# Altium footprint library Connectors.PCBLIB: 126 footprints (part 8 of 8)
Each footprint in its own frame and in the unit in brackets; x right, y up, seen from the top. Pads: shape width x height; smd on the part's side, far side on the other; paste and mask are expansions set on the pad; w line width, h text height; cw(c..) or ccw(c..) is an arc to the next point about the centre after c.
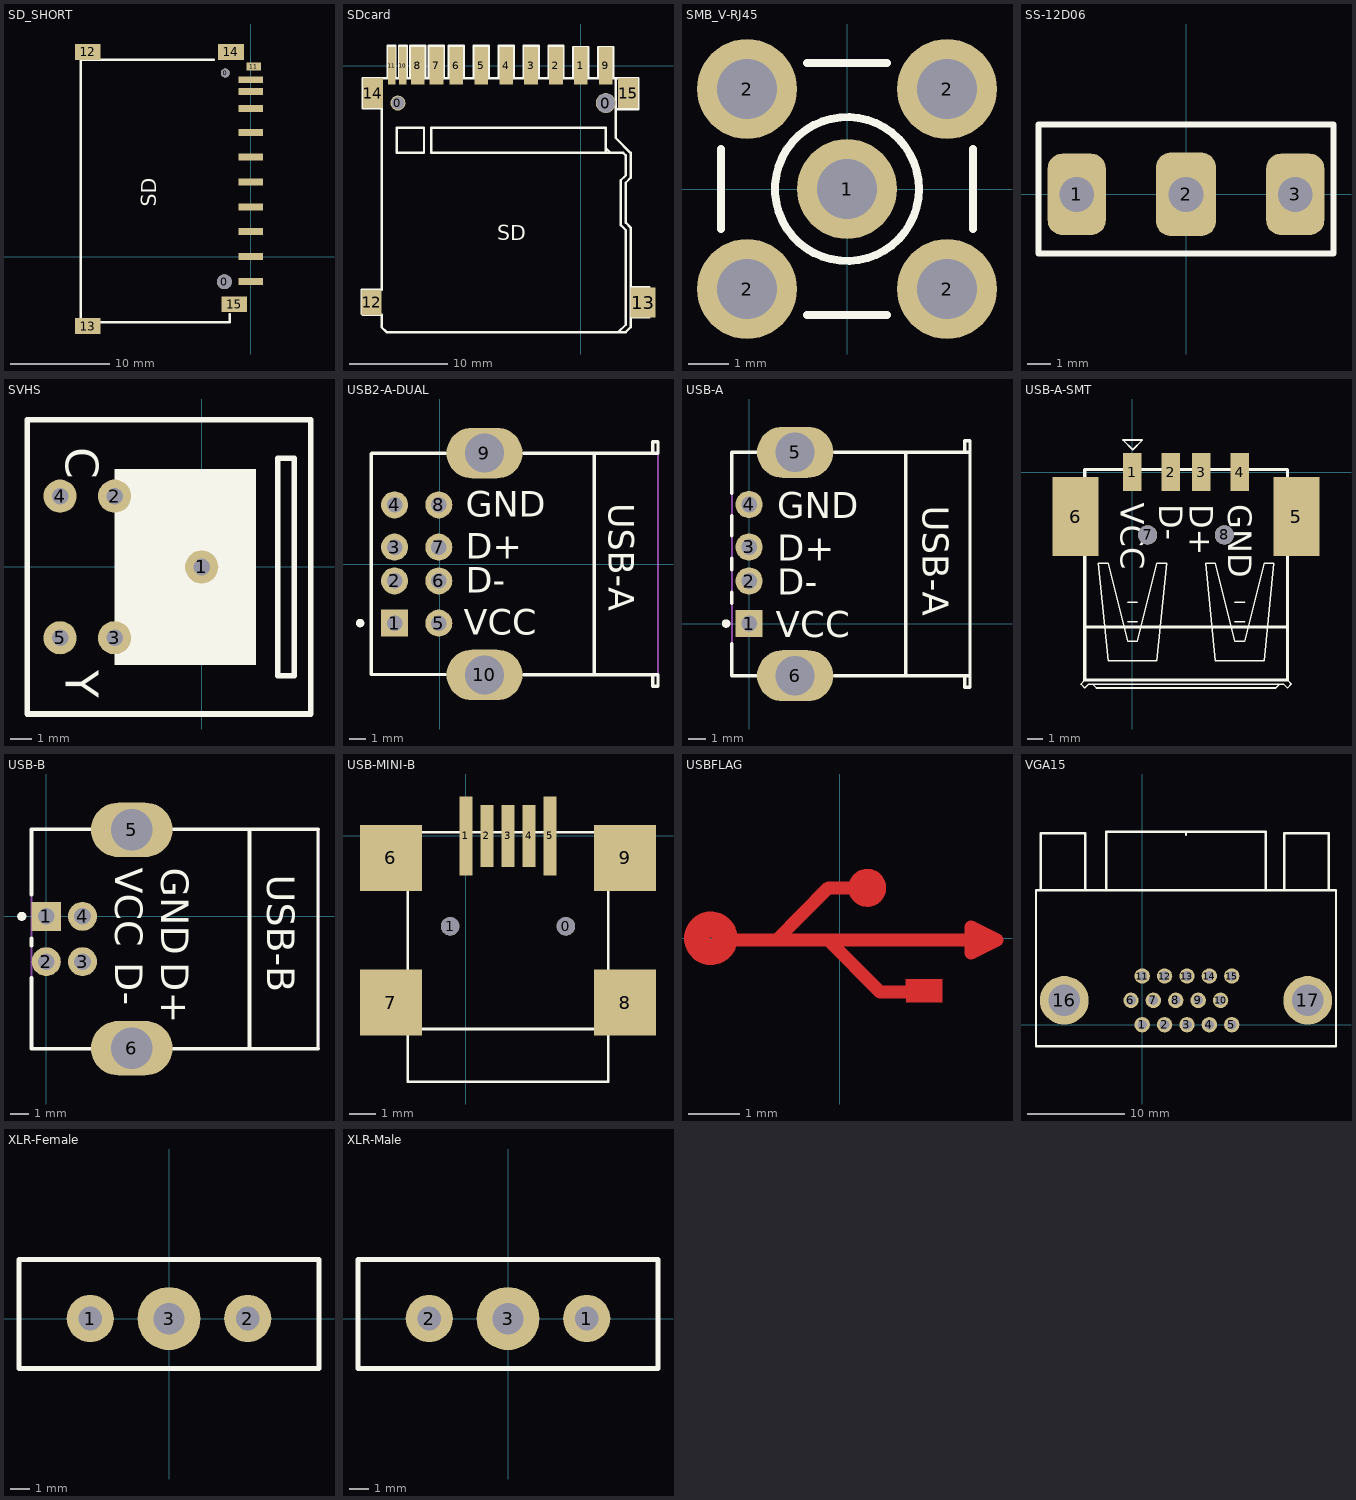
[diagram p7: the footprints below, top view; thin cyan lines are the x and y axes]

## SD_SHORT [mm]
height 3
pads (17):
  round 1.5 hole 1.5: 0(-2.656,-2.54)
  round 0.9 hole 0.9 unplated: 0(-2.566,18.475)
  rect 2.5x0.7 smd: 1(0,0) 2(0,2.5) 3(0,5) 4(0,7.5) 5(0,10) 6(0,12.5) 7(0,14.925) 8(0,16.625) 9(0,-2.5) 10(0,17.8)
  rect 1.5x0.8 smd: 11(0.3,19.13)
  rect 2.6x1.6 smd: 12(-16.404,20.6) 13(-16.404,-7) 14(-1.988,20.6) 15(-1.664,-4.8)
Top Overlay:
  lines w0.254: -3.7,19.8 -17.1,19.8 -17.1,-6.6 -2.1,-6.6 -2.1,-5.8
  text "SD" at -9.5,5 h1.52

## SDcard [mil] "WWW.OURAVR.COM"
pads (17):
  round 60 hole 52: 0(-735,-150)
  round 80 hole 75: 0(100,-150)
  rect 55x150 smd: 1(0,0) 2(-100,0) 3(-200,0) 4(-300,0) 5(-400,0) 6(-500,0) 7(-580,0) 8(-655,0) 9(100,0)
  rect 30x150 smd: 10(-715,0) 11(-760,0)
  rect 80x100 smd: 12(-840,-950)
  rect 100x120 smd: 13(249.63,-950.84)
  rect 80x120 smd: 14(-835,-110) 15(190,-110)
Top Overlay:
  lines w10: -775,-50 -775,80 -745,80 -745,-50 -800,-50 -875,-50 -875,-170 -800,-170 -800,-900 -880,-900 -880,-995 -875,-1000 -800,-1000 -800,-1050 -780,-1070 -770,-1070 180,-1070 200,-1050 200,-650 180,-630 180,-470 200,-450 200,-440 200,-370 200,-350 140,-290 140,-60 140,-50 ; -750,-50 140,-50 ; -730,-50 -730,80 -700,80 -700,-50 ; -685,-45 -685,80 -625,80 -625,-45 ; -650,-350 -630,-350 -630,-250 -740,-250 -740,-350 -640,-350 ; -610,-45 -610,80 -550,80 -550,-45 ; -530,-45 -530,80 -470,80 -470,-45 ; -430,-45 -430,80 -370,80 -370,-45 ; -330,-45 -330,80 -270,80 -270,-45 ; -230,-45 -230,80 -170,80 -170,-45 ; -130,-45 -130,80 -70,80 -70,-45 ; -30,-50 -30,75 30,75 30,-50 ; 70,-50 70,75 130,75 130,-50 ; 100,-330 120,-350 ; 140,-175 230,-175 230,-50 140,-50 ; 150,-1070 180,-1040 180,-670 180,-660 160,-640 160,-460 180,-440 180,-360 170,-350 100,-350 ; 200,-1010 275,-1010 ; 200,-890 275,-890 ; 100,-350 100,-340 100,-250 -600,-250 -600,-350 100,-350
  text "SD" at -335,-700 h60

## SMB_V-RJ45 [mm] "Connector; SMB Straight"
pads (5):
  round 2.5 hole 1.5: 1(0,0) 2(-2.5,-2.5) 2(-2.5,2.5) 2(2.5,-2.5) 2(2.5,2.5)
Top Overlay:
  circle w0.2: c0,0 r1.8
  lines w0.2: -3.15,-1 -3.15,1 ; -1,-3.15 1,-3.15 ; -1,3.15 1,3.15 ; 3.15,-1 3.15,1
Mechanical 1:
  circle w0.025: c0,0 r0.2
  circle w0.025: c0,0 r1.05
  circle w0.025: c0,0 r1.8

## SS-12D06 [mm]
pads (3):
  rrect50% 2.5x3.5 hole 1.5 square: 1(-4.7,0) 3(4.7,0)
  rrect50% 2.6x3.6 hole 1.5 square: 2(0,0)
Top Overlay:
  lines w0.254: -6.35,-2.54 -6.35,3 6.35,3 6.35,-2.54 -6.35,-2.54

## SVHS [mil] "S VIDEO PORT"
pads (5):
  round 60 hole 30: 1(0,0) 2(-157.48,127.95) 3(-157.48,-127.95) 4(-255.91,127.95) 5(-255.91,-127.95)
Top Overlay:
  rectangle: -157.48,-177.17 98.43,177.17
  lines w10: -314.96,-265.75 -314.96,265.75 196.85,265.75 196.85,-265.75 -314.96,-265.75 ; 137.8,-196.85 167.32,-196.85 167.32,196.85 137.8,196.85 137.8,-196.85
  text "Y" at -246.06,-187.01 h60
  text "C" at -246.06,216.54 h60
3D body "SVHS.STEP": height 767.72, standoff -59.06, extent -314.96,-255.9 118.11,255.91

## USB2-A-DUAL [mm] "Connector; USB1.1, Type A, Thru-Hole; 4x4 Position; Right Angle"
height 15.82
pads (10):
  rect 1.6x1.6 hole 0.92: 1(-2.665,-3.5)
  round 1.6 hole 0.92: 2(-2.665,-1) 3(-2.665,1) 4(-2.665,3.5) 5(-0.045,-3.5) 6(-0.045,-1) 7(-0.045,1) 8(-0.045,3.5)
  oval 4.5x3 hole 2.3: 9(2.665,6.57) 10(2.665,-6.57)
Top Overlay:
  circle w0.25: c-4.705,-3.5 r0.125
  lines w0.2: 0.343,-6.548 -0.757,-6.548 -4.062,-6.548 -4.055,-6.541 -4.055,-4.51 -4.055,4.51 -4.055,6.54 -4.025,6.57 -0.715,6.57 0.365,6.57 ; 4.975,-6.57 12.945,-6.57 12.945,-7.25 12.625,-7.25 12.625,-6.57 ; 4.975,6.57 12.945,6.57 12.945,7.25 12.625,7.25 12.625,6.57
  lines w0.203: 9.165,-6.57 9.165,6.53
  text "VCC" at 1.445,-4.189 h1.52
  text "D-" at 1.545,-1.689 h1.52
  text "D+" at 1.545,0.311 h1.52
  text "GND" at 1.545,2.811 h1.52
  text "USB-A" at 10.035,3.612 h1.52
Mechanical 1:
  lines w0.1: 12.945,-6.57 12.945,6.57
  text "PCB Edge" at 12.577,-6.15 h0.2
Mechanical 13:
  lines w0.1: -4.055,-6.57 12.625,-6.57 12.625,-7.25 12.945,-7.25 12.945,7.25 12.625,7.25 12.625,6.57 -4.055,6.57
3D body: height 15.82, standoff 0, extent -4.054,-7.249 12.944,7.249

## USB-A [mm] "Connector; USB1.1, Type A, Thru-Hole; 4 Position; Right Angle"
height 7.01
pads (6):
  rect 1.6x1.6 hole 0.92: 1(0,0)
  round 1.6 hole 0.92: 2(0,2.5) 3(0,4.5) 4(0,7)
  oval 4.5x3 hole 2.3: 5(2.71,10.07) 6(2.71,-3.07)
Top Overlay:
  circle w0.25: c-1.35,0 r0.125
  lines w0.2: -1.01,-1.2 -1.01,-3.065 0.41,-3.065 ; -1.01,1.2 -1.01,1.84 ; -1.01,3.16 -1.01,3.84 ; -1.01,5.16 -1.01,6.34 ; -1.01,7.66 -1.01,10.065 0.41,10.065 ; 5.01,-3.065 12.99,-3.065 ; 5.01,10.065 12.99,10.065 ; 12.67,-3.065 12.67,-3.75 12.99,-3.75 12.99,-3.065 ; 12.67,10.065 12.67,10.75 12.99,10.75 12.99,10.065 ; 12.99,-3.065 12.99,10.065
  lines w0.203: 9.21,-3.065 9.21,10.065
  text "USB-A" at 10.21,6.93 h1.52
  text "VCC" at 1.57,-0.816 h1.52
  text "D-" at 1.67,1.684 h1.52
  text "D+" at 1.67,3.684 h1.52
  text "GND" at 1.67,6.184 h1.52
Mechanical 13:
  lines w0.1: -1.01,-3.065 12.67,-3.065 12.67,-3.75 12.99,-3.75 12.99,10.75 12.67,10.75 12.67,10.065 -1.01,10.065 -1.01,-3.065
3D body: height 7.01, standoff 0, extent -1.009,-3.749 12.989,10.749

## USB-A-SMT [mm]
pads (8):
  rect 1.2x2.5 smd: 1(0,0) 2(2.5,0) 3(4.5,0) 4(7,0)
  rect 3x5.15 smd: 5(10.7,-2.9) 6(-3.7,-2.9)
  round 1.25 hole 1.25 unplated: 7(1,-4.1) 8(6,-4.1)
Top Overlay:
  lines w0.1: -3.097,-13.559 -3.351,-13.813 -3.097,-14.067 -2.843,-13.813 -2.589,-13.813 ; -0.303,-9.749 0.332,-9.749 ; -0.303,-8.479 0.332,-8.479 ; 6.682,-9.749 7.317,-9.749 ; 6.682,-8.479 7.317,-8.479 ; 10.111,-13.559 10.365,-13.813 10.111,-14.067 9.857,-13.813 9.603,-13.813 ; -2.589,-13.813 9.603,-13.813 ; -2.589,-13.813 -2.335,-14.073 9.349,-14.073 9.603,-13.813 ; -2.208,-5.939 -1.573,-5.939 -0.303,-11.019 0.332,-11.019 1.602,-5.939 2.237,-5.939 1.602,-12.289 -1.573,-12.289 -2.208,-5.939 ; -0.613,2.09 0.657,2.09 0.022,1.455 -0.613,2.09 ; 4.777,-5.939 5.412,-5.939 6.682,-11.019 7.317,-11.019 8.587,-5.939 9.222,-5.939 8.587,-12.289 5.412,-12.289 4.777,-5.939
  lines w0.203: -3.097,-10.1 10.111,-10.1 ; -3.097,-13.559 -3.097,0.157 10.111,0.157 10.111,-13.559 -3.097,-13.559
  text "VCC" at -0.745,-1.987 h1.52
  text "D-" at 1.755,-2.087 h1.52
  text "D+" at 3.755,-2.087 h1.52
  text "GND" at 6.255,-2.087 h1.52
3D body: height 6.69, standoff 0, extent -3.097,-13.558 10.11,0.157

## USB-B [mm] "Connector; USB1.1, Type B, Thru-Hole; 4 Position; Right Angle"
height 10.95
pads (6):
  rect 1.6x1.6 hole 0.92: 1(0,0)
  round 1.6 hole 0.92: 2(0,-2.5) 3(2,-2.5) 4(2,0)
  oval 4.5x3 hole 2.3: 5(4.71,4.77) 6(4.71,-7.27)
Top Overlay:
  circle w0.25: c-1.35,0 r0.125
  lines w0.154: 14.99,-7.3 14.99,4.8
  lines w0.2: -0.81,-3.39 -0.81,-7.3 2.41,-7.3 ; -0.81,-1.61 -0.81,-1.2 ; -0.81,1.2 -0.81,4.8 2.41,4.8 ; 7.01,-7.3 14.99,-7.3 ; 7.01,4.8 14.99,4.8
  lines w0.203: 11.21,-7.3 11.21,4.8
  text "VCC" at 3.81,2.667 h1.52
  text "D-" at 3.81,-2.54 h1.52
  text "D+" at 6.35,-2.54 h1.52
  text "GND" at 6.35,2.667 h1.52
  text "USB-B" at 12.192,2.286 h1.52
Mechanical 1:
  lines w0.1: 15.01,-7.3 15.01,4.8
Mechanical 13:
  lines w0.1: -0.81,-7.3 14.99,-7.3 14.99,4.8 -0.81,4.8 -0.81,-7.3
3D body: height 10.95, standoff 0, extent -0.81,-7.3 14.99,4.8
3D body: height 4, standoff -2, extent -0.42,-2.899 0.373,-2.106
3D body: height 4, standoff -2, extent 1.605,-2.874 2.398,-2.081
3D body: height 4, standoff -2, extent 1.605,-0.399 2.398,0.394
3D body: height 4, standoff -2, extent -0.395,-0.399 0.398,0.394

## USB-MINI-B [mm]
pads (11):
  round 0.7 hole 0.7: 0(3.8,-3.435) 1(-0.6,-3.435)
  rect 0.5x3 smd: 1(0,0) 5(3.2,-0.001)
  rect 0.5x2.35 smd: 2(0.8,0) 3(1.6,0) 4(2.4,0)
  rect 2.35x2.5 smd: 6(-2.85,-0.835) 7(-2.85,-6.335) 8(6.05,-6.335) 9(6.05,-0.835)
Top Overlay:
  lines w0.1: -2.21,-7.335 5.41,-7.335 ; -2.21,-9.335 5.41,-9.335 5.41,0.142 -2.21,0.142 -2.21,-6.97 -2.21,-9.335
3D body: height 6.69, standoff 0, extent -2.26,-9.385 5.46,0.192

## USBFLAG [mm]
Top Layer:
  circle w0.5: c-2.5,0 r0.268
  circle w0.25: c0.536,0.979 r0.244
  rectangle: 1.29,-1.25 2,-0.792
  region: 1.29,-0.792 1.829,-0.792 1.829,-1.068 1.29,-1.068
  lines w0: 1.29,-1.068 1.29,-0.792 1.829,-0.792 1.829,-1.068 1.29,-1.068
  lines w0.252: -2.234,-0.033 2.802,-0.033 ; -1.227,-0.033 -0.22,0.979 0.536,0.979 ; -0.22,-0.033 0.788,-1.045 1.291,-1.045 ; 2.55,-0.286 3.054,-0.033 2.55,0.22
  lines w0.254: 2.55,-0.286 2.55,0.22

## VGA15 [mm]
pads (17):
  round 1.58 hole 1: 1(0,0) 2(2.3,0) 3(4.6,0) 4(6.9,0) 5(9.2,0) 6(-1.15,2.5) 7(1.15,2.5) 8(3.45,2.5) 9(5.75,2.5) 10(8.05,2.5) 11(0,5) 12(2.3,5) 13(4.6,5) 14(6.9,5) 15(9.2,5)
  round 5 hole 3.25: 16(-8,2.5) 17(17,2.5)
Top Overlay:
  lines w0.254: -10.9,-2.2 -10.9,13.8 19.9,13.8 19.9,-2.2 -10.89,-2.2 -10.9,-2.19 ; -10.4,13.8 -10.4,19.67 -5.83,19.67 -5.83,13.82 ; -3.7,13.8 -3.7,19.8 12.7,19.8 12.7,13.8 ; 4.5,19.5 4.5,19.8 ; 14.6,13.8 14.6,19.68 19.18,19.68 19.18,13.84
3D body "SW3dPS-Connector, D-Sub, 15 pin HD, RA, Receptacle.STEP": height 12.77, standoff -3.27, extent -11.055,-0.875 19.755,20.225

## XLR-Female [mm] "XLR Female PCB Mount"
pads (3):
  round 2.4 hole 1.2: 1(-4,0) 2(4,0)
  round 3.2 hole 1.6: 3(0,0)
Top Overlay:
  lines w0.254: -7.62,-2.54 7.62,-2.54 7.62,3 -7.62,3 -7.62,-2.54

## XLR-Male [mm] "XLR Male PCB Mount"
pads (3):
  round 2.4 hole 1.2: 1(4,0) 2(-4,0)
  round 3.2 hole 1.6: 3(0,0)
Top Overlay:
  lines w0.254: -7.62,-2.54 7.62,-2.54 7.62,3 -7.62,3 -7.62,-2.54